# Altium footprint library разъёмы.PcbLib: 129 footprints (part 2 of 9)
Each footprint in its own frame and in the unit in brackets; x right, y up, seen from the top. Pads: shape width x height; smd on the part's side, far side on the other; paste and mask are expansions set on the pad; w line width, h text height; cw(c..) or ccw(c..) is an arc to the next point about the centre after c.
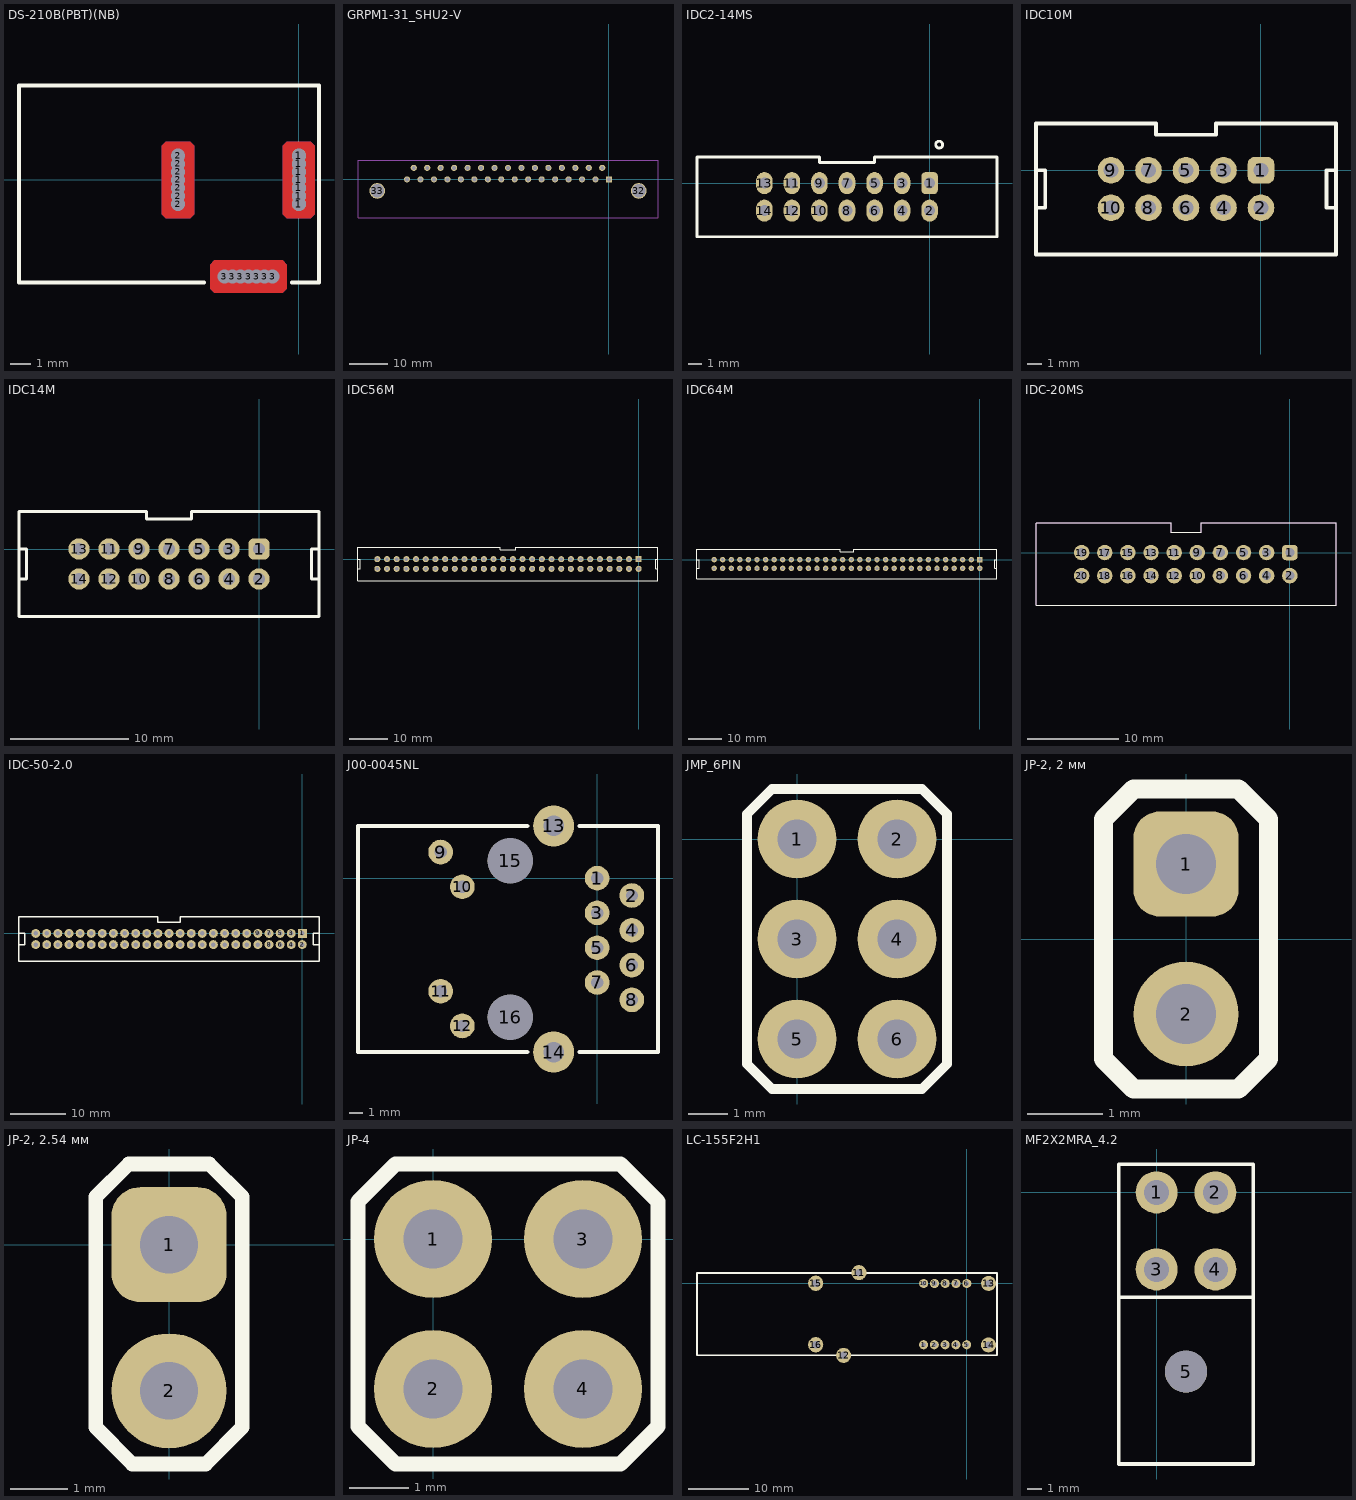
[diagram p1: the footprints below, top view; thin cyan lines are the x and y axes]

## DS-210B(PBT)(NB) [mm] "DS-210, Гнездо питания 2,1х5,5мм на панель"
pads (21):
  round 0.7 hole 0.7: 1(0,-1.2) 1(0,-0.8) 1(0,-0.4) 1(0,0) 1(0,0.4) 1(0,0.8) 1(0,1.2)
  round 0.6 hole 0.7: 2(-6,-1.2) 2(-6,-0.8) 2(-6,-0.4) 2(-6,0) 2(-6,0.4) 2(-6,0.8) 2(-6,1.2) 3(-3.7,-4.8) 3(-3.3,-4.8) 3(-2.9,-4.8) 3(-2.5,-4.8) 3(-2.1,-4.8) 3(-1.7,-4.8) 3(-1.3,-4.8)
Top Layer:
  region: -4.2,-4 -4.4,-4.2 -4.4,-5.4 -4.2,-5.6 -0.8,-5.6 -0.6,-5.4 -0.6,-4.2 -0.8,-4
  region: -6.8,-1.7 -6.6,-1.9 -5.4,-1.9 -5.2,-1.7 -5.2,1.7 -5.4,1.9 -6.6,1.9 -6.8,1.7
  region: -0.8,-1.7 -0.6,-1.9 0.6,-1.9 0.8,-1.7 0.8,1.7 0.6,1.9 -0.6,1.9 -0.8,1.7
Bottom Layer:
  region: -4.2,-4 -4.4,-4.2 -4.4,-5.4 -4.2,-5.6 -0.8,-5.6 -0.6,-5.4 -0.6,-4.2 -0.8,-4
  region: -6.8,-1.7 -6.6,-1.9 -5.4,-1.9 -5.2,-1.7 -5.2,1.7 -5.4,1.9 -6.6,1.9 -6.8,1.7
  region: -0.8,-1.7 -0.6,-1.9 0.6,-1.9 0.8,-1.7 0.8,1.7 0.6,1.9 -0.6,1.9 -0.8,1.7
Top Overlay:
  lines w0.2: -4.7,-5.1 -13.9,-5.1 -13.9,4.7 1,4.7 1,-5.1 -0.35,-5.1
Mechanical 13:
  lines w0.1: -4.7,-5.1 -13.9,-5.1 -13.9,4.7 1,4.7 1,-5.1 -0.4,-5.1
  text ".Designator" at -12.1,2.8 h1.5
3D body "User Library-ds-210.SLDPRT": height 11, standoff -4.4, extent -13.8,-4.975 0.7,4.575

## GRPM1-31_SHU2-V [mm]
pads (33):
  round 4.1 hole 3.5: 32(7.75,-3) 33(-60.25,-3)
  round 1.6 hole 1: A1(-1.75,3) A2(-5.25,3) A3(-8.75,3) A4(-12.25,3) A5(-15.75,3) A6(-19.25,3) A7(-22.75,3) A8(-26.25,3) A9(-29.75,3) A10(-33.25,3) A11(-36.75,3) A12(-40.25,3) A13(-43.75,3) A14(-47.25,3) A15(-50.75,3) B2(-3.5,0) B3(-7,0) B4(-10.5,0) B5(-14,0) B6(-17.5,0) B7(-21,0) B8(-24.5,0) B9(-28,0) B10(-31.5,0) B11(-35,0) B12(-38.5,0) B13(-42,0) B14(-45.5,0) B15(-49,0) B16(-52.5,0)
  rect 1.6x1.6 hole 1: B1(0,0)
Mechanical 1:
  lines w0.1: -65.25,-10 12.75,-10 12.75,5 -65.25,5 -65.25,-10

## IDC2-14MS [mm] "2x7, шаг 2.0 мм"
pads (14):
  rrect50% 1.2x1.6 hole 0.8 mask+0.025: 1(0,0)
  oval 1.2x1.6 hole 0.8 mask+0.025: 2(0,-2) 3(-2,0) 4(-2,-2) 5(-4,0) 6(-4,-2) 7(-6,0) 8(-6,-2) 9(-8,0) 10(-8,-2) 11(-10,0) 12(-10,-2) 13(-12,0) 14(-12,-2)
Top Overlay:
  circle w0.2: c0.7,2.8 r0.25
  lines w0.2: -16.9,-3.9 -16.9,1.9 -8,1.9 -8,1.5 -4,1.5 -4,1.9 4.9,1.9 4.9,-3.9 -16.9,-3.9
3D body "header_awhw214g-0202.SLDPRT": height 5.75, standoff -2.8, extent -16.5,-3.75 4.5,1.75

## IDC10M [mm]
pads (10):
  rrect50% 1.8x1.8 hole 1: 1(0,0)
  round 1.8 hole 1: 2(0,-2.54) 3(-2.54,0) 4(-2.54,-2.54) 5(-5.08,0) 6(-5.08,-2.54) 7(-7.62,0) 8(-7.62,-2.54) 9(-10.16,0) 10(-10.16,-2.54)
Top Overlay:
  lines w0.254: -15.24,-2.54 -14.605,-2.54 -14.605,0 -15.24,0 ; 5.08,-2.54 4.445,-2.54 4.445,0 5.08,0 ; -15.24,-5.715 -15.24,3.175 -7.112,3.175 -7.112,2.413 -3.048,2.413 -3.048,3.175 5.08,3.175 5.08,-5.715 -15.24,-5.715

## IDC14M [mm]
pads (14):
  rrect50% 1.8x1.8 hole 1: 1(0,0)
  round 1.8 hole 1: 2(0,-2.54) 3(-2.54,0) 4(-2.54,-2.54) 5(-5.08,0) 6(-5.08,-2.54) 7(-7.62,0) 8(-7.62,-2.54) 9(-10.16,0) 10(-10.16,-2.54) 11(-12.7,0) 12(-12.7,-2.54) 13(-15.24,0) 14(-15.24,-2.54)
Top Overlay:
  lines w0.254: -20.32,-2.54 -19.685,-2.54 -19.685,0 -20.32,0 ; 5.08,-2.54 4.445,-2.54 4.445,0 5.08,0 ; -20.32,-5.715 5.08,-5.715 5.08,3.175 -5.715,3.175 -5.715,2.54 -9.525,2.54 -9.525,3.175 -20.32,3.175 -20.32,-5.715

## IDC56M [mm]
pads (56):
  rect 1.6x1.6 hole 0.9: 1(0,0)
  round 1.6 hole 0.9: 2(0,-2.54) 3(-2.54,0) 4(-2.54,-2.54) 5(-5.08,0) 6(-5.08,-2.54) 7(-7.62,0) 8(-7.62,-2.54) 9(-10.16,0) 10(-10.16,-2.54) 11(-12.7,0) 12(-12.7,-2.54) 13(-15.24,0) 14(-15.24,-2.54) 15(-17.78,0) 16(-17.78,-2.54) 17(-20.32,0) 18(-20.32,-2.54) 19(-22.86,0) 20(-22.86,-2.54) 21(-25.4,0) 22(-25.4,-2.54) 23(-27.94,0) 24(-27.94,-2.54) 25(-30.48,0) 26(-30.48,-2.54) 27(-33.02,0) 28(-33.02,-2.54) 29(-35.56,0) 30(-35.56,-2.54) 31(-38.1,0) 32(-38.1,-2.54) 33(-40.64,0) 34(-40.64,-2.54) 35(-43.18,0) 36(-43.18,-2.54) 37(-45.72,0) 38(-45.72,-2.54) 39(-48.26,0) 40(-48.26,-2.54) 41(-50.8,0) 42(-50.8,-2.54) 43(-53.34,0) 44(-53.34,-2.54) 45(-55.88,0) 46(-55.88,-2.54) 47(-58.42,0) 48(-58.42,-2.54) 49(-60.96,0) 50(-60.96,-2.54) 51(-63.5,0) 52(-63.5,-2.54) 53(-66.04,0) 54(-66.04,-2.54) 55(-68.58,0) 56(-68.58,-2.54)
Top Overlay:
  lines w0.254: -73.66,-2.54 -73.025,-2.54 -73.025,0 -73.66,0 ; 5.08,-2.54 4.445,-2.54 4.445,0 5.08,0 ; -73.66,-5.715 5.08,-5.715 5.08,3.175 -32.258,3.175 -32.258,2.413 -36.322,2.413 -36.322,3.175 -73.66,3.175 -73.66,-5.715

## IDC64M [mm]
pads (64):
  rect 1.6x1.6 hole 0.9: 1(0,0)
  round 1.6 hole 0.9: 2(0,-2.54) 3(-2.54,0) 4(-2.54,-2.54) 5(-5.08,0) 6(-5.08,-2.54) 7(-7.62,0) 8(-7.62,-2.54) 9(-10.16,0) 10(-10.16,-2.54) 11(-12.7,0) 12(-12.7,-2.54) 13(-15.24,0) 14(-15.24,-2.54) 15(-17.78,0) 16(-17.78,-2.54) 17(-20.32,0) 18(-20.32,-2.54) 19(-22.86,0) 20(-22.86,-2.54) 21(-25.4,0) 22(-25.4,-2.54) 23(-27.94,0) 24(-27.94,-2.54) 25(-30.48,0) 26(-30.48,-2.54) 27(-33.02,0) 28(-33.02,-2.54) 29(-35.56,0) 30(-35.56,-2.54) 31(-38.1,0) 32(-38.1,-2.54) 33(-40.64,0) 34(-40.64,-2.54) 35(-43.18,0) 36(-43.18,-2.54) 37(-45.72,0) 38(-45.72,-2.54) 39(-48.26,0) 40(-48.26,-2.54) 41(-50.8,0) 42(-50.8,-2.54) 43(-53.34,0) 44(-53.34,-2.54) 45(-55.88,0) 46(-55.88,-2.54) 47(-58.42,0) 48(-58.42,-2.54) 49(-60.96,0) 50(-60.96,-2.54) 51(-63.5,0) 52(-63.5,-2.54) 53(-66.04,0) 54(-66.04,-2.54) 55(-68.58,0) 56(-68.58,-2.54) 57(-71.12,0) 58(-71.12,-2.54) 59(-73.66,0) 60(-73.66,-2.54) 61(-76.2,0) 62(-76.2,-2.54) 63(-78.74,0) 64(-78.74,-2.54)
Top Overlay:
  lines w0.254: -83.82,-2.54 -83.185,-2.54 -83.185,0 -83.82,0 ; 5.08,-2.54 4.445,-2.54 4.445,0 5.08,0 ; -83.82,-5.715 -83.82,3.175 -41.402,3.175 -41.402,2.413 -37.338,2.413 -37.338,3.175 5.08,3.175 5.08,-5.715 -83.82,-5.715

## IDC-20MS [mm]
pads (20):
  rrect50% 1.7x1.7 hole 1: 1(0,0)
  round 1.7 hole 1: 2(0,-2.54) 3(-2.54,0) 4(-2.54,-2.54) 5(-5.08,0) 6(-5.08,-2.54) 7(-7.62,0) 8(-7.62,-2.54) 9(-10.16,0) 10(-10.16,-2.54) 11(-12.7,0) 12(-12.7,-2.54) 13(-15.24,0) 14(-15.24,-2.54) 15(-17.78,0) 16(-17.78,-2.54) 17(-20.32,0) 18(-20.32,-2.54) 19(-22.86,0) 20(-22.86,-2.54)
Top Overlay:
  lines w0.1: -27.87,3.23 -27.87,-5.77 -7.62,-5.77 ; -27.87,3.25 -13.05,3.25 -13.05,2.2 -9.75,2.2 -9.75,3.25 5.07,3.25 ; -15.18,-5.77 5.07,-5.77 5.07,3.23
Mechanical 13:
  lines w0.1: -27.87,3.23 -27.87,-5.77 -7.62,-5.77 ; -27.87,3.25 -13.05,3.25 -13.05,2.2 -9.75,2.2 -9.75,3.25 5.07,3.25 ; -15.18,-5.77 5.07,-5.77 5.07,3.23
  text ".Designator" at -10.3,0 h1.5
3D body "IDC-20MS.STEP": height 9.3, standoff -2.79, extent -27.9,-5.475 5.1,2.925

## IDC-50-2.0 [mm]
pads (50):
  rect 1.6x1.6 hole 0.8: 1(0,0)
  round 1.6 hole 0.8: 2(0,-2) 3(-2,0) 4(-2,-2) 5(-4,0) 6(-4,-2) 7(-6,0) 8(-6,-2) 9(-8,0) 10(-8,-2) 11(-10,0) 12(-10,-2) 13(-12,0) 14(-12,-2) 15(-14,0) 16(-14,-2) 17(-16,0) 18(-16,-2) 19(-18,0) 20(-18,-2) 21(-20,0) 22(-20,-2) 23(-22,0) 24(-22,-2) 25(-24,0) 26(-24,-2) 27(-26,0) 28(-26,-2) 29(-28,0) 30(-28,-2) 31(-30,0) 32(-30,-2) 33(-32,0) 34(-32,-2) 35(-34,0) 36(-34,-2) 37(-36,0) 38(-36,-2) 39(-38,0) 40(-38,-2) 41(-40,0) 42(-40,-2) 43(-42,0) 44(-42,-2) 45(-44,0) 46(-44,-2) 47(-46,0) 48(-46,-2) 49(-48,0) 50(-48,-2)
Top Overlay:
  lines w0.254: -51,-2 -50,-2 -50,0 -51,0 ; 3,-2 2,-2 2,0 3,0 ; -51,-5 -51,3 -26,3 -26,2 -22,2 -22,3 3,3 3,-5 -51,-5

## J00-0045NL [mm]
pads (16):
  round 1.8 hole 0.9 mask+0.025: 1(0,0) 2(2.54,-1.27) 3(0,-2.54) 4(2.54,-3.81) 5(0,-5.08) 6(2.54,-6.35) 7(0,-7.62) 8(2.54,-8.89) 9(-11.43,1.905) 10(-9.842,-0.635) 11(-11.43,-8.255) 12(-9.842,-10.795)
  round 3 hole 1.5 mask+0.025: 13(-3.175,3.81) 14(-3.175,-12.7)
  round 3.3 hole 3.3 mask+0.025: 15(-6.35,1.27) 16(-6.35,-10.16)
Top Overlay:
  lines w0.3: -5.1,-12.7 -17.462,-12.7 -17.462,3.81 -5.1,3.81 ; -1.3,-12.7 4.445,-12.7 4.445,3.81 -1.3,3.81
3D body "1-2301994-0.SLDPRT": height 15.8, standoff -3.5, extent -17.075,-14.4 4.275,5.6

## JMP_6PIN [mm]
pads (6):
  round 2 hole 1: 1(0,0) 2(2.54,0) 3(0,-2.54) 4(2.54,-2.54) 5(0,-5.08) 6(2.54,-5.08)
Top Overlay:
  lines w0.254: -1.27,-5.715 -1.27,0.635 -0.635,1.27 3.175,1.27 3.81,0.635 3.81,-5.715 3.175,-6.35 -0.635,-6.35 -1.27,-5.715

## JP-2, 2 мм [mm] "Перемычка PLS2-2 с джампером"
pads (2):
  rrect50% 1.4x1.4 hole 0.8 mask+0.05: 1(0,1)
  round 1.4 hole 0.8 mask+0.05: 2(0,-1)
Top Overlay:
  lines w0.254: -1.1,-1.6 -1.1,1.6 -0.7,2 0.7,2 1.1,1.6 1.1,-1.6 0.7,-2 -0.7,-2 -1.1,-1.6

## JP-2, 2.54 мм [mm] "Перемычка PLS-2 с джампером"
pads (2):
  rrect50% 2x2 hole 1: 1(0,0)
  round 2 hole 1: 2(0,-2.54)
Top Overlay:
  lines w0.254: -1.27,-3.175 -1.27,0.83 -0.7,1.4 0.7,1.4 1.27,0.83 1.27,-3.175 0.635,-3.81 -0.635,-3.81 -1.27,-3.175
3D body "User Library-PLD-2.SLDPRT": height 8.5, standoff -3, extent -1.27,-3.81 1.27,1.19

## JP-4 [mm]
pads (4):
  round 2 hole 1: 1(0,0) 2(0,-2.54) 3(2.54,0) 4(2.54,-2.54)
Top Overlay:
  lines w0.254: -1.27,-3.175 -0.635,-3.81 3.175,-3.81 3.81,-3.175 3.81,0.635 3.175,1.27 -0.635,1.27 -1.27,0.635 -1.27,-3.175

## LC-155F2H1 [mm]
pads (16):
  round 1.5 hole 0.8: 1(-7.14,-10.12) 2(-5.36,-10.12) 3(-3.58,-10.12) 4(-1.8,-10.12) 5(-0.02,-10.12) 6(0,0) 7(-1.78,0) 8(-3.56,0) 9(-5.34,0) 10(-7.12,0)
  round 2.5 hole 1.2: 11(-17.816,1.786) 12(-20.356,-11.866) 13(3.61,0.01) 14(3.59,-10.15) 15(-24.96,0.04) 16(-24.96,-10.12)
Top Overlay:
  lines w0.3: -44.57,-11.86 -44.56,1.74 ; -44.57,-11.85 4.99,-11.85 4.99,1.74 -44.57,1.74

## MF2X2MRA_4.2 [mm]
pads (5):
  round 3 hole 1.8: 1(0,0) 2(4.2,0) 3(0,-5.5) 4(4.2,-5.5)
  round 3 hole 3: 5(2.1,-12.8)
Top Overlay:
  lines w0.254: -2.6,-7.5 6.8,-7.5 ; -2.7,-19.4 6.9,-19.4 6.9,2 -2.7,2 -2.7,-19.4
Mechanical 13:
  lines w0.1: -2.7,-19.4 6.9,-19.4 6.9,2.032 -2.7,2.032 -2.7,-19.4
  text ".Designator" at 3.3,-6.9 h1.5
3D body "User Library-Mini-Fit 4pin (MF-4MRA).STEP": height 11.4, standoff -3.6, extent -2.7,-19.335 7.3,0.6